# Altium footprint library Iris.PcbLib: 90 footprints (part 5 of 6)
Each footprint in its own frame and in the unit in brackets; x right, y up, seen from the top. Pads: shape width x height; smd on the part's side, far side on the other; paste and mask are expansions set on the pad; w line width, h text height; cw(c..) or ccw(c..) is an arc to the next point about the centre after c.
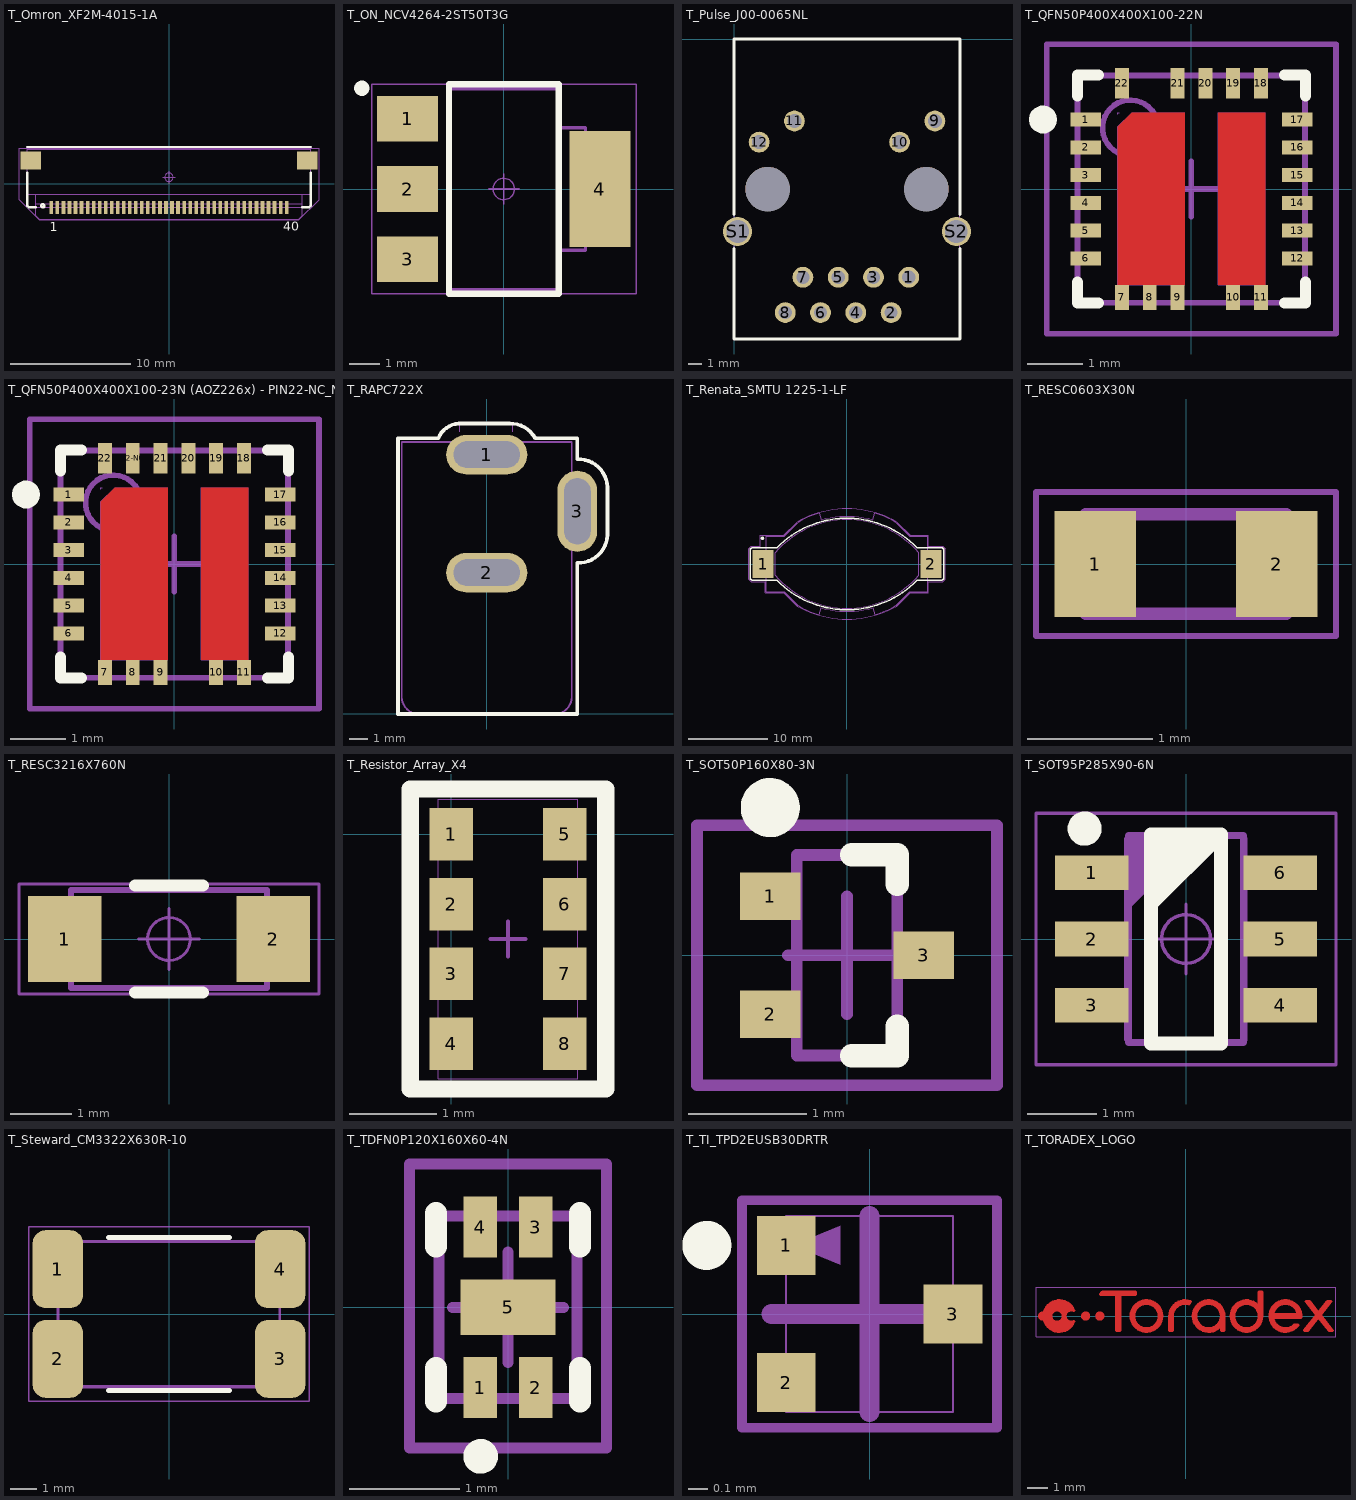
[diagram p4: the footprints below, top view; thin cyan lines are the x and y axes]

## T_Omron_XF2M-4015-1A [mm] "DVI FFC Connector 0.5mm pitch"
height 2
pads (42):
  rect 0.3x1.1 smd: 1(-9.75,-1.95) 2(-9.25,-1.95) 3(-8.75,-1.95) 4(-8.25,-1.95) 5(-7.75,-1.95) 6(-7.25,-1.95) 7(-6.75,-1.95) 8(-6.25,-1.95) 9(-5.75,-1.95) 10(-5.25,-1.95) 11(-4.75,-1.95) 12(-4.25,-1.95) 13(-3.75,-1.95) 14(-3.25,-1.95) 15(-2.75,-1.95) 16(-2.25,-1.95) 17(-1.75,-1.95) 18(-1.25,-1.95) 19(-0.75,-1.95) 20(-0.25,-1.95) 21(0.25,-1.95) 22(0.75,-1.95) 23(1.25,-1.95) 24(1.75,-1.95) 25(2.25,-1.95) 26(2.75,-1.95) 27(3.25,-1.95) 28(3.75,-1.95) 29(4.25,-1.95) 30(4.75,-1.95) 31(5.25,-1.95) 32(5.75,-1.95) 33(6.25,-1.95) 34(6.75,-1.95) 35(7.25,-1.95) 36(7.75,-1.95) 37(8.25,-1.95) 38(8.75,-1.95) 39(9.25,-1.95) 40(9.75,-1.95)
  rect 1.7x1.5 smd: ""(-11.45,1.95) ""(11.45,1.95)
Top Overlay:
  circle w0.2: c-10.459,-1.819 r0.125
  lines w0.2: -11.752,0.919 -11.752,-1.798 -11.6,-1.95 -11.05,-1.95 ; -11.752,3.057 11.75,3.057 ; 11.05,-1.95 11.6,-1.95 11.75,-1.8 11.75,0.917
  text "40" at 9.46,-3.899 h0.75
  text "1" at -9.885,-3.908 h0.75
Mechanical 1:
  circle w0.05: c0,0.55 r0.35
  lines w0.05: -0.5,0.55 0.5,0.55 ; 0,0.05 0,1.05 ; -12.436,-1.303 -10.761,-2.978 10.762,-2.978 12.436,-1.304 12.436,2.95 -12.436,2.95 -12.436,-1.303
Mechanical 2:
  lines w0.001: -11.75,-0.85 11.75,-0.85 ; -11.05,-1.95 -11.6,-1.95 -11.75,-1.8 -11.75,1.45 -12.05,1.45 -12.05,2.55 -11.75,2.55 -11.75,2.95 11.75,2.95 11.75,2.55 12.05,2.55 12.05,1.45 11.75,1.45 11.75,-1.8 11.6,-1.95 11.05,-1.95 ; -11.05,-1.65 11.05,-1.65 ; -11.05,-0.85 -11.05,-2.65 -10.75,-2.95 10.75,-2.95 11.05,-2.65 11.05,-0.85
Mechanical 3:
  lines w0.1: -11.752,-1.798 -11.6,-1.95 11.6,-1.95 11.75,-1.8 11.75,2.884 -11.752,2.884 -11.752,-1.798
3D body "xf2m-4015-1a.stp": height 2.02, standoff 0.02, extent -12.05,-2.95 12.05,2.95

## T_ON_NCV4264-2ST50T3G [mm] "SO4"
height 1.8
pads (4):
  rect 2x1.5 smd: 1(-3.15,2.3) 2(-3.15,0) 3(-3.15,-2.3)
  rect 2x3.8 smd: 4(3.15,0)
Top Overlay:
  circle w0.25: c-4.65,3.3 r0.125
  lines w0.2: -1.8,-3.43 1.8,-3.43 1.8,3.43 -1.8,3.43 -1.8,-3.43
Mechanical 1:
  circle w0.05: c0,0 r0.35
  lines w0.05: -0.5,0 0.5,0 ; 0,-0.5 0,0.5 ; -4.33,-3.43 4.33,-3.43 4.33,3.43 -4.33,3.43 -4.33,-3.43
Mechanical 2:
  lines w0.001: -1.85,-3.251 -1.85,3.251 1.85,3.251 1.85,-3.251 -1.85,-3.251
Mechanical 3:
  lines w0.1: 1.79,-2.006 2.68,-2.006 2.68,2.006 1.79,2.006 ; -1.79,-3.302 1.79,-3.302 1.79,3.302 -1.79,3.302 -1.79,-3.302
3D body "User Library-SOT223-3.step": height 1.7, standoff 0, extent -3.5,-3.25 3.5,3.25

## T_Pulse_J00-0065NL [mm] "RJ45 Connector"
height 13.84
pads (16):
  round 1.5 hole 0.95: 1(12.575,-17.15) 2(11.305,-19.69) 3(10.035,-17.15) 4(8.765,-19.69) 5(7.495,-17.15) 6(6.225,-19.69) 7(4.955,-17.15) 8(3.685,-19.69)
  round 1.5 hole 1.02: 9(14.455,-5.9) 10(11.915,-7.42) 11(4.345,-5.9) 12(1.805,-7.42)
  round 2.1 hole 1.63: S1(0.255,-13.85) S2(16.005,-13.85)
  round 3.2 hole 3.2 unplated: ""(2.415,-10.8) ""(13.845,-10.8)
Top Overlay:
  lines w0.2: 0,-15.086 0,-21.59 16.26,-21.59 16.26,-15.086 ; 0,-12.621 0,0 ; 16.26,-12.621 16.26,0 ; 0,0 16.26,0 ; 0,0 0,0 ; 16.26,0 16.26,0
Mechanical 1:
  lines w0.05: 0,-15.328 0,-21.59 16.26,-21.59 16.26,-15.328 ; 0,-12.626 0,0 16.26,0 16.26,-12.626
Mechanical 2:
  lines w0.001: 0,-21.59 0,0 16.26,0 16.26,-21.59 0,-21.59
Mechanical 3:
  lines w0.1: 0,-15.039 0,-21.59 16.26,-21.59 16.26,-15.039 ; 0,-12.612 0,0 16.26,0 16.26,-12.612
3D body "7499010211A.stp": height 13.32, standoff -3.23, extent 0.19,-21.75 16.07,0.09

## T_QFN50P400X400X100-22N [mm] "QFN, 22-Leads, Body 4.1x4.1mm (max), Pitch 0.50mm, IPC Medium Density"
height 1
pads (22):
  rect 0.55x0.25 smd mask+0.051: 1(-1.9,1.25) 2(-1.9,0.75) 3(-1.9,0.25) 4(-1.9,-0.25) 5(-1.9,-0.75) 6(-1.9,-1.25) 12(1.9,-1.25) 13(1.9,-0.75) 14(1.9,-0.25) 15(1.9,0.25) 16(1.9,0.75) 17(1.9,1.25)
  rect 0.25x0.45 smd mask+0.051: 7(-1.25,-1.95) 8(-0.75,-1.95) 9(-0.25,-1.95) 10(0.75,-1.95) 11(1.25,-1.95)
  rect 0.25x0.55 smd mask+0.051: 18(1.25,1.9) 19(0.75,1.9) 20(0.25,1.9) 21(-0.25,1.9) 22(-1.25,1.9)
Top Layer:
  region: -1.33,1.118 -1.073,1.375 -0.125,1.375 -0.125,-1.725 -1.33,-1.725
  region: 1.33,1.375 0.48,1.375 0.48,-1.725 1.33,-1.725
Top Overlay:
  circle w0.25: c-2.671,1.25 r0.125
  lines w0.2: -2.05,-1.676 -2.05,-2.05 -1.676,-2.05 ; -2.05,1.676 -2.05,2.05 -1.676,2.05 ; 1.676,-2.05 2.05,-2.05 2.05,-1.676 ; 1.676,2.05 2.05,2.05 2.05,1.676
Mechanical 1:
  lines w0.1: -0.5,0 0.5,0 ; 0,-0.5 0,0.5 ; -2.6,-2.6 -2.6,2.6 2.6,2.6 2.6,-2.6 -2.6,-2.6
Mechanical 2:
  lines w0.01: -1.325,1.345 -1.325,1.375 -1.295,1.375 ; -2,-2 -2,2 2,2 2,-2 -2,-2 ; -1.325,-1.725 -0.125,-1.725 -0.125,1.375 -1.068,1.375 -1.325,1.118 -1.325,-1.725 ; 0.48,-1.725 0.48,1.375 1.33,1.375 1.33,-1.725 0.48,-1.725
Mechanical 3:
  circle w0.1: c-1.1,1.1 r0.5
  lines w0.1: -2.05,-2.05 -2.05,2.05 2.05,2.05 2.05,-2.05 -2.05,-2.05
3D body: height 1, standoff 0.01, extent -2,-2 2,2

## T_QFN50P400X400X100-23N (AOZ226x) - PIN22-NC_NOPASTE [mm] "QFN, 23-Leads, Body 4.1x4.1mm (max), Pitch 0.50mm, IPC Medium Density"
height 1
pads (23):
  rect 0.55x0.25 smd mask+0.051: 1(-1.9,1.25) 2(-1.9,0.75) 3(-1.9,0.25) 4(-1.9,-0.25) 5(-1.9,-0.75) 6(-1.9,-1.25) 12(1.9,-1.25) 13(1.9,-0.75) 14(1.9,-0.25) 15(1.9,0.25) 16(1.9,0.75) 17(1.9,1.25)
  rect 0.25x0.45 smd mask+0.051: 7(-1.25,-1.95) 8(-0.75,-1.95) 9(-0.25,-1.95) 10(0.75,-1.95) 11(1.25,-1.95)
  rect 0.25x0.55 smd mask+0.051: 18(1.25,1.9) 19(0.75,1.9) 20(0.25,1.9) 21(-0.25,1.9) 22(-1.25,1.9)
  rect 0.25x0.55 smd paste-0.25 mask+0.051: 22-NC(-0.75,1.9)
Top Layer:
  region: 1.33,1.375 0.48,1.375 0.48,-1.725 1.33,-1.725
  region: -1.33,1.118 -1.073,1.375 -0.125,1.375 -0.125,-1.725 -1.33,-1.725
Top Overlay:
  circle w0.25: c-2.671,1.25 r0.125
  lines w0.2: -2.05,-1.676 -2.05,-2.05 -1.676,-2.05 ; -2.05,1.676 -2.05,2.05 -1.676,2.05 ; 1.676,-2.05 2.05,-2.05 2.05,-1.676 ; 1.676,2.05 2.05,2.05 2.05,1.676
Mechanical 1:
  lines w0.1: -0.5,0 0.5,0 ; 0,-0.5 0,0.5 ; -2.6,-2.6 2.6,-2.6 2.6,2.6 -2.6,2.6 -2.6,-2.6
Mechanical 2:
  lines w0.01: -1.325,1.345 -1.325,1.375 -1.295,1.375 ; -2,-2 2,-2 2,2 -2,2 -2,-2 ; -1.325,-1.725 -1.325,1.118 -1.068,1.375 -0.125,1.375 -0.125,-1.725 -1.325,-1.725 ; 0.48,-1.725 1.33,-1.725 1.33,1.375 0.48,1.375 0.48,-1.725
Mechanical 3:
  circle w0.1: c-1.1,1.1 r0.5
  lines w0.1: -2.05,-2.05 2.05,-2.05 2.05,2.05 -2.05,2.05 -2.05,-2.05
3D body: height 1, standoff 0.01, extent -2,-2 2,2

## T_RAPC722X [mm] "Connector, 2.1mm (Dia), 5.5mm(Dia), Round Power Socket"
height 10.7
pads (3):
  oval 4.3x2.1 hole 1.4 slot 3.5 at 0 deg: 1(0,13.74) 2(0,7.49)
  oval 2.1x4.3 hole 1.4 slot 3.5 at 90 deg: 3(4.8,10.74)
Top Overlay:
  lines w0.2: 1.196,15.393 -1.3,15.393 ccw(c-1.385,14.115) -2.569,14.6 -4.7,14.6 -4.7,0 4.79,0 4.79,8 ccw(c4.843,9.553) 6.396,9.499 6.396,11.996 ccw(c4.841,11.945) 4.79,13.5 4.79,14.59 4.78,14.6 2.569,14.6 ccw(c1.234,13.866) 1.2,15.388
Mechanical 1:
  lines w0.05: -1.332,15.393 1.164,15.393 ; -1.332,15.394 ccw(c-1.384,14.115) -2.568,14.6 -4.7,14.6 -4.7,0 4.8,0 4.8,8 ccw(c4.843,9.553) 6.396,9.499 6.396,11.996 ccw(c4.841,11.945) 4.8,13.5 4.8,14.6 2.568,14.6 ; 1.169,15.388 cw(c1.203,13.866) 2.537,14.6
Mechanical 2:
  lines w0.001: -1.432,14.95 -1.432,15.4 ; -1.4,13.95 -1.4,14.4 -4.5,14.4 -4.5,0.9 ccw(c-3.6,0.9) -3.6,0 3.6,0 ; 1.368,14.95 1.368,15.4 ; 1.4,13.95 1.4,14.4 4.5,14.4 4.5,0.9 cw(c3.6,0.9) 3.6,0
Mechanical 3:
  lines w0.1: -4.5,0.9 ccw(c-3.6,0.9) -3.6,0 3.6,0 ccw(c3.6,0.9) 4.5,0.9 4.5,14.4 -4.5,14.4 -4.5,0.9
3D body: height 10.7, standoff 0, extent -4.5,0 4.5,14.4
3D body: height 4, standoff -3.7, extent 4.5,9.45 4.7,11.85
3D body: height 4, standoff -3.7, extent -1.2,7.55 1.2,7.75
3D body: height 4, standoff -3.7, extent -1.4,13.55 1.4,13.75
3D body: height 9.59, standoff 3.21, extent -3.2,0 3.175,2
3D body: height 7.4, standoff 5.4, extent -1,0 0.992,2

## T_Renata_SMTU 1225-1-LF [mm] "Battery Holder"
height 4.8
pads (2):
  rect 2.6x3.5 smd: 1(-10.55,0) 2(10.55,0)
Top Overlay:
  circle w0.2: c-10.625,3.25 r0.125
  lines w0.2: -8.8,2.05 -11.95,2.05 -12.15,1.85 -12.15,-1.85 -11.95,-2.05 -8.795,-2.05 ; -8.799,-2.05 ccw(c0,6.55) 8.794,-2.055 ; -8.794,2.055 cw(c0,-6.55) 8.799,2.05 ; 8.797,-2.05 11.95,-2.05 12.15,-1.85 12.15,1.86 11.96,2.05 8.797,2.05
Mechanical 1:
  lines w0.05: -7.924,-3.605 -10.247,-3.605 -10.247,-2.251 -12.024,-2.251 -12.357,-1.918 -12.357,1.926 -12.026,2.257 -10.918,2.257 -10.918,3.585 -7.95,3.585 -6.259,5.275 ; -7.92,-3.607 -6.244,-5.283 ; -6.262,5.274 cw(c0,-5.7) 6.276,5.266 ; -6.238,-5.288 ccw(c0,5.7) 6.239,-5.287 ; 6.244,-5.282 7.933,-3.593 10.237,-3.593 10.237,-2.245 12.04,-2.245 12.345,-1.94 12.345,1.939 12.037,2.247 10.242,2.247 10.242,3.589 7.956,3.589 6.281,5.265 6.281,5.266
Mechanical 2:
  lines w0.01: -6.194,5.206 -7.9,3.5 -10.15,3.5 -10.15,-3.5 -7.9,-3.5 -6.191,-5.209 ; -6.192,5.208 cw(c0.004,-5.568) -3.513,6.355 ; -6.189,-5.21 ccw(c0,5.57) -3.515,-6.353 ; -3.514,-6.353 -3.256,-5.514 ccw(c0.001,6.351) 3.246,-5.517 ; -3.513,6.354 -3.246,5.517 ; -3.245,5.516 cw(c0,-6.352) 3.246,5.516 3.505,6.356 cw(c0,-5.57) 6.189,5.21 ; 3.247,-5.517 3.517,-6.352 ccw(c0,5.57) 6.198,-5.205 7.903,-3.5 7.899,-3.5 10.15,-3.5 10.15,3.5 7.9,3.5 6.192,5.209
Mechanical 3:
  lines w0.1: -9.03,-1.42 -9.03,1.42 ; -9.028,-1.424 ccw(c0,6.357) 9.028,-1.424 ; -9.028,1.424 cw(c0,-6.357) 9.028,1.424 ; 9.026,-1.424 9.026,1.416

## T_RESC0603X30N [mm] "Film Resistor 0603 (1608 metric), max height 0.45mm"
height 0.45
pads (2):
  rect 0.65x0.85 smd: 1(-0.725,0) 2(0.725,0)
Mechanical 1:
  lines w0.05: -1.2,-0.575 1.2,-0.575 1.2,0.575 -1.2,0.575 -1.2,-0.575
Mechanical 2:
  lines w0.001: -0.8,-0.4 0.8,-0.4 0.8,0.4 -0.8,0.4 -0.8,-0.4
Mechanical 3:
  lines w0.1: -0.8,-0.4 0.8,-0.4 0.8,0.4 -0.8,0.4 -0.8,-0.4
3D body "User Library-RES_1609-0603.step": height 0.56, standoff 0, extent -0.85,-0.4 0.85,0.4

## T_RESC3216X760N [mm]
height 0.6
pads (2):
  rect 1.2x1.4 smd: 1(-1.7,0) 2(1.7,0)
Top Overlay:
  lines w0.2: -0.55,-0.875 0.55,-0.875 ; -0.55,0.875 0.55,0.875
Mechanical 1:
  circle w0.05: c0,0 r0.35
  lines w0.05: -0.5,0 0.5,0 ; 0,-0.5 0,0.5 ; -2.45,-0.9 2.45,-0.9 2.45,0.9 -2.45,0.9 -2.45,-0.9
Mechanical 2:
  lines w0.001: -1.6,-0.8 -1.6,0.8 1.6,0.8 1.6,-0.8 -1.6,-0.8
Mechanical 3:
  lines w0.1: -1.6,-0.8 1.6,-0.8 1.6,0.8 -1.6,0.8 -1.6,-0.8
3D body: height 0.6, standoff 0, extent -1.6,-0.8 1.6,0.8

## T_Resistor_Array_X4 [mm] "Resistor Array 0.8mm"
pads (8):
  rect 0.5x0.6 smd: 1(0,0) 2(0,-0.8) 3(0,-1.6) 4(0,-2.4) 5(1.3,0) 6(1.3,-0.8) 7(1.3,-1.6) 8(1.3,-2.4)
Top Overlay:
  lines w0.2: -0.47,-2.92 1.77,-2.92 1.77,0.52 -0.47,0.52 -0.47,-2.92
Mechanical 1:
  lines w0.05: 0.45,-1.2 0.85,-1.2 ; 0.65,-1.4 0.65,-1 ; -0.47,-2.92 1.77,-2.92 1.77,0.52 -0.47,0.52 -0.47,-2.92
Mechanical 2:
  lines w0.001: -0.15,-2.8 1.45,-2.8 1.45,0.4 -0.15,0.4 -0.15,-2.8
Mechanical 3:
  lines w0.1: -0.47,-2.92 1.77,-2.92 1.77,0.52 -0.47,0.52 -0.47,-2.92
3D body "User Library-Array-1206-4Way-Var1.STEP": height 0.5, standoff 0, extent -0.15,-2.8 1.45,0.4

## T_SOT50P160X80-3N [mm] "SOT23, 3-Leads, Body 1.7x1.8mm (max), Pitch 0.50mm, IPC Medium Density"
height 0.8
pads (3):
  rect 0.51x0.4 smd: 1(-0.65,0.5) 2(-0.65,-0.5) 3(0.65,0)
Top Overlay:
  circle w0.25: c-0.65,1.25 r0.125
  lines w0.2: 0.039,-0.85 0.425,-0.85 0.425,-0.6 ; 0.039,0.85 0.425,0.85 0.425,0.6
Mechanical 1:
  lines w0.1: -1.27,-1.1 1.27,-1.1 1.27,1.1 -1.27,1.1 -1.27,-1.1
Mechanical 3:
  lines w0.1: -0.5,0 0.5,0 ; 0,-0.5 0,0.5 ; -0.425,-0.85 0.425,-0.85 0.425,0.85 -0.425,0.85 -0.425,-0.85
3D body: height 0.8, standoff 0.12, extent -0.425,-0.85 0.425,0.85

## T_SOT95P285X90-6N [mm]
height 1.45
pads (6):
  rect 1.05x0.5 smd: 1(-1.35,0.95) 2(-1.35,0) 3(-1.35,-0.95) 4(1.35,-0.95) 5(1.35,0) 6(1.35,0.95)
Top Overlay:
  circle w0.25: c-1.453,1.582 r0.12
  lines w0.2: -0.5,0.5 0.5,1.5 ; -0.5,0.7 0.3,1.5 ; -0.5,0.9 0.1,1.5 ; -0.5,1.1 -0.1,1.5 ; -0.5,1.3 -0.3,1.5 ; 0.5,1.5 -0.5,1.5 -0.5,-1.5 0.5,-1.5 0.5,1.5
Mechanical 1:
  circle w0.05: c0,0 r0.35
  lines w0.05: -0.5,0 0.5,0 ; 0,-0.5 0,0.5 ; -2.15,-1.8 -2.15,1.8 2.15,1.8 2.15,-1.8 -2.15,-1.8
Mechanical 2:
  lines w0.001: -0.875,-1.45 0.875,-1.45 0.875,1.45 -0.875,1.45 -0.875,-1.45
Mechanical 3:
  lines w0.1: -0.825,0.485 0.175,1.485 ; -0.825,0.585 0.075,1.485 ; -0.825,0.685 -0.025,1.485 ; -0.825,0.785 -0.125,1.485 ; -0.825,0.885 -0.225,1.485 ; -0.825,0.985 -0.325,1.485 ; -0.825,1.085 -0.425,1.485 ; -0.825,1.185 -0.525,1.485 ; -0.825,1.285 -0.625,1.485 ; -0.825,1.385 -0.725,1.485 ; -0.825,-1.485 -0.825,1.485 0.825,1.485 0.825,-1.485 -0.825,-1.485
3D body "User Library-SOT23-6-2.step": height 1.45, standoff 0, extent -1.4,-1.45 1.4,1.45

## T_Steward_CM3322X630R-10 [mm] "Common Mode Choke"
height 2.85
pads (4):
  rrect50% 1.91x2.95 smd: 1(-4.22,1.705) 2(-4.22,-1.705) 3(4.22,-1.705) 4(4.22,1.705)
Top Overlay:
  lines w0.2: -2.3,-2.902 2.3,-2.902 ; -2.3,2.904 2.3,2.904
Mechanical 1:
  lines w0.05: -5.316,-3.321 5.316,-3.321 5.316,3.321 -5.316,3.321 -5.316,-3.321
Mechanical 2:
  lines w0.001: -4.25,-2.8 4.25,-2.8 4.25,2.8 -4.25,2.8 -4.25,-2.8
Mechanical 3:
  lines w0.1: -4.2,-2.75 4.2,-2.75 4.2,2.75 -4.2,2.75 -4.2,-2.75

## T_TDFN0P120X160X60-4N [mm] "TDFN, 4-Leads, Body 1.6x1.2mm (max), Pitch 0.50mm, IPC Medium Density"
height 0.6
pads (5):
  rect 0.3x0.55 smd: 1(-0.25,-0.725) 2(0.25,-0.725) 3(0.25,0.725) 4(-0.25,0.725)
  rect 0.86x0.5 smd paste-0.05: 5(0,0)
Top Overlay:
  circle w0.175: c-0.247,-1.346 r0.069
  lines w0.2: -0.65,-0.85 -0.65,-0.55 ; -0.65,0.55 -0.65,0.85 ; 0.65,-0.85 0.65,-0.55 ; 0.65,0.55 0.65,0.85
Mechanical 1:
  lines w0.1: -0.889,-1.27 0.889,-1.27 0.889,1.295 -0.889,1.295 -0.889,-1.27
Mechanical 3:
  lines w0.1: -0.5,0 0.5,0 ; 0,-0.5 0,0.5 ; -0.625,-0.825 0.625,-0.825 0.625,0.825 -0.625,0.825 -0.625,-0.825
3D body: height 0.6, standoff 0.05, extent -0.625,-0.825 0.625,0.825

## T_TI_TPD2EUSB30DRTR [mm] "2 CHANNEL PROTECTION SOLUTION FOR SUPER-SPEED"
height 0.5
pads (3):
  rect 0.3x0.3 smd: 1(-0.425,0.35) 2(-0.425,-0.35) 3(0.425,0)
Top Overlay:
  circle w0.15: c-0.83,0.35 r0.05
Mechanical 1:
  lines w0.05: -0.65,-0.58 -0.65,0.58 0.65,0.58 0.65,-0.58 -0.65,-0.58
Mechanical 2:
  lines w0.01: -0.425,-0.5 0.425,-0.5 0.425,0.5 -0.425,0.5 -0.425,-0.5
Mechanical 3:
  region: -0.39,0.35 -0.15,0.45 -0.15,0.25
  lines w0.1: -0.5,0 0.5,0 ; 0,-0.5 0,0.5
3D body: height 0.5, standoff 0, extent -0.425,-0.5 0.425,0.5

## T_TORADEX_LOGO [mm] "Toradex Logo"
Top Layer:
  lines w0.15: -6.969,-0.148 cw(c-6.99,0) -7.14,0 cw(c-6.99,0) -6.969,0.148 ; -6.97,0 -6.854,0 ; -6.898,-0.21 ccw(c-6.177,0) -5.475,-0.269 ; -6.898,0.21 cw(c-6.177,0) -5.475,0.269 ; -6.765,-0.068 ccw(c-6.958,-0.227) -6.854,0 ; -6.765,0.068 cw(c-6.958,0.227) -6.854,0 ; -6.619,-0.35 ccw(c-6.177,0) -5.81,-0.428 cw(c-5.593,0) -5.942,-0.329 cw(c-6.29,0) -6.77,0 cw(c-6.29,0) -5.942,0.329 cw(c-5.593,0) -5.81,0.428 ccw(c-6.177,0) -6.619,0.35 ; -6.338,-0.54 ccw(c-6.29,0) -5.942,-0.415 ccw(c-5.593,0) -5.921,-0.431 cw(c-6.177,0) -6.046,-0.484 ; -6.338,0.54 cw(c-6.29,0) -5.942,0.415 cw(c-5.593,0) -5.921,0.431 ccw(c-6.177,0) -6.046,0.484 ; -5.49,-0.282 cw(c-5.593,0) -5.49,0.282 ; 4.229,0.004 4.848,0.004 5.529,0.004 ccw(c4.848,0) 5.359,-0.449 ; 4.233,-0.066 4.848,-0.066 5.596,-0.066 ccw(c4.848,0) 5.45,-0.449 5.273,-0.449 cw(c4.848,0) 5.463,0.066 4.848,0.066 4.233,0.066 ; -7.095,0 cw(c-6.99,0) -6.976,0.104 ccw(c-6.958,0.227) -6.838,0.193 cw(c-6.177,0) -5.586,0.355 ccw(c-5.593,0) -5.942,0.064 ccw(c-6.29,0) -5.942,-0.064 ccw(c-5.593,0) -5.586,-0.355 cw(c-6.177,0) -6.838,-0.193 ccw(c-6.958,-0.227) -6.976,-0.104 ; -7.095,0 ccw(c-6.99,0) -6.976,-0.104 ; -7.095,0 ccw(c-6.99,0) -6.976,-0.104 ; -7.033,0 cw(c-6.99,0) -6.984,0.042 ccw(c-6.958,0.227) -6.778,0.175 cw(c-6.177,0) -5.698,0.404 ccw(c-5.593,0) -5.942,0.229 ccw(c-6.29,0) -5.942,-0.229 ccw(c-5.593,0) -5.698,-0.404 cw(c-6.177,0) -6.778,-0.175 ccw(c-6.958,-0.227) -6.984,-0.042 cw(c-6.99,0) -7.033,0 ; -6.59,0 ccw(c-6.29,0) -5.99,0 ccw(c-6.29,0) -6.59,0 ; -5.048,0 cw(c-4.898,0) -4.748,0 cw(c-4.898,0) -5.048,0 ; -5.003,0 cw(c-4.898,0) -4.793,0 cw(c-4.898,0) -5.003,0 ; -4.94,0 cw(c-4.898,0) -4.856,0 cw(c-4.898,0) -4.94,0 ; -4.352,0 cw(c-4.202,0) -4.052,0 cw(c-4.202,0) -4.352,0 ; -4.307,0 cw(c-4.202,0) -4.097,0 cw(c-4.202,0) -4.307,0 ; -4.244,0 cw(c-4.202,0) -4.16,0 cw(c-4.202,0) -4.244,0 ; -4.176,1.044 -3.377,1.044 -3.377,-0.701 -3.226,-0.701 -3.226,1.044 -2.457,1.044 -2.457,1.174 -4.072,1.174 -4.176,1.044 ; -4.046,1.106 -3.315,1.106 -3.315,-0.638 -3.288,-0.638 -3.288,1.106 -2.519,1.106 -2.519,1.112 -4.042,1.112 -4.046,1.106 ; -2.681,0 cw(c-1.93,0) -1.178,0 cw(c-1.93,0) -2.681,0 ; -2.619,0 cw(c-1.93,0) -1.241,0 cw(c-1.93,0) -2.619,0 ; -2.548,0 cw(c-1.93,0) -1.311,0 cw(c-1.93,0) -2.548,0 ; -0.793,-0.701 -0.66,-0.701 -0.66,0 cw(c-0.042,0) 0.137,0.592 cw(c1.104,0) 0.216,0.705 ccw(c-0.042,0) -0.793,0 -0.793,-0.701 ; -0.731,-0.638 -0.723,-0.638 -0.723,0 cw(c-0.042,0) 0.109,0.664 cw(c1.104,0) 0.114,0.671 ccw(c-0.042,0) -0.731,0 -0.731,-0.638 ; 0.352,0 cw(c1.104,0) 1.855,0 1.855,-0.701 1.722,-0.701 1.722,-0.427 cw(c1.104,0) 0.352,0 ; 0.415,0 cw(c1.104,0) 1.793,0 1.793,-0.638 1.785,-0.638 1.785,-0.104 cw(c1.104,0) 0.415,0 ; 0.485,0 ccw(c1.104,0) 1.722,0 ccw(c1.104,0) 0.485,0 ; 2.199,0 cw(c2.95,0) 3.569,0.427 3.569,1.174 3.702,1.174 3.702,0 cw(c2.95,0) 2.199,0 ; 2.261,0 cw(c2.95,0) 3.631,0.104 3.631,1.112 3.639,1.112 3.639,0 cw(c2.95,0) 2.261,0 ; 2.332,0 ccw(c2.95,0) 3.569,0 ccw(c2.95,0) 2.332,0 ; 5.769,-0.701 5.937,-0.701 6.46,-0.036 6.98,-0.701 7.14,-0.701 6.548,0.056 7.065,0.714 6.895,0.714 6.46,0.15 6.025,0.714 5.862,0.714 6.375,0.055 5.769,-0.701 ; 5.899,-0.638 5.906,-0.638 6.46,0.065 7.011,-0.638 7.012,-0.638 6.469,0.056 6.936,0.651 6.926,0.651 6.46,0.048 5.994,0.651 5.99,0.651 6.455,0.055 5.899,-0.638
Top Solder:
  lines w0.35: -6.969,-0.148 cw(c-6.99,0) -7.14,0 cw(c-6.99,0) -6.969,0.148 ; -6.97,0 -6.854,0 ; -6.967,-0.166 cw(c-6.958,-0.227) -6.898,-0.21 ccw(c-6.177,0) -5.475,-0.269 ; -6.967,0.166 ccw(c-6.958,0.227) -6.898,0.21 cw(c-6.177,0) -5.475,0.269 ; -6.765,-0.068 ccw(c-6.958,-0.227) -6.854,0 ; -6.765,0.068 cw(c-6.958,0.227) -6.854,0 ; -6.619,-0.35 ccw(c-6.177,0) -5.81,-0.428 cw(c-5.593,0) -5.942,-0.329 cw(c-6.29,0) -6.77,0 cw(c-6.29,0) -5.942,0.329 cw(c-5.593,0) -5.81,0.428 ccw(c-6.177,0) -6.619,0.35 ; -6.338,-0.54 ccw(c-6.29,0) -5.942,-0.415 ccw(c-5.593,0) -5.921,-0.431 cw(c-6.177,0) -6.046,-0.484 ; -6.338,0.54 cw(c-6.29,0) -5.942,0.415 cw(c-5.593,0) -5.921,0.431 ccw(c-6.177,0) -6.046,0.484 ; -5.485,-0.28 cw(c-5.593,0) -5.485,0.28 ; 4.229,0.004 4.848,0.004 5.529,0.004 ccw(c4.848,0) 5.359,-0.449 ; 4.233,-0.066 4.848,-0.066 5.596,-0.066 ccw(c4.848,0) 5.45,-0.449 5.273,-0.449 cw(c4.848,0) 5.463,0.066 4.848,0.066 4.233,0.066 ; -7.095,0 cw(c-6.99,0) -6.976,0.104 ccw(c-6.958,0.227) -6.838,0.193 cw(c-6.177,0) -5.586,0.355 ccw(c-5.593,0) -5.942,0.064 ccw(c-6.29,0) -5.942,-0.064 ccw(c-5.593,0) -5.586,-0.355 cw(c-6.177,0) -6.838,-0.193 ccw(c-6.958,-0.227) -6.976,-0.104 ; -7.095,0 ccw(c-6.99,0) -6.976,-0.104 ; -7.095,0 ccw(c-6.99,0) -6.976,-0.104 ; -7.033,0 cw(c-6.99,0) -6.984,0.042 ccw(c-6.958,0.227) -6.778,0.175 cw(c-6.177,0) -5.698,0.404 ccw(c-5.593,0) -5.942,0.229 ccw(c-6.29,0) -5.942,-0.229 ccw(c-5.593,0) -5.698,-0.404 cw(c-6.177,0) -6.778,-0.175 ccw(c-6.958,-0.227) -6.984,-0.042 cw(c-6.99,0) -7.033,0 ; -6.59,0 ccw(c-6.29,0) -5.99,0 ccw(c-6.29,0) -6.59,0 ; -5.048,0 cw(c-4.898,0) -4.748,0 cw(c-4.898,0) -5.048,0 ; -5.003,0 cw(c-4.898,0) -4.793,0 cw(c-4.898,0) -5.003,0 ; -4.94,0 cw(c-4.898,0) -4.856,0 cw(c-4.898,0) -4.94,0 ; -4.352,0 cw(c-4.202,0) -4.052,0 cw(c-4.202,0) -4.352,0 ; -4.307,0 cw(c-4.202,0) -4.097,0 cw(c-4.202,0) -4.307,0 ; -4.244,0 cw(c-4.202,0) -4.16,0 cw(c-4.202,0) -4.244,0 ; -4.176,1.044 -3.377,1.044 -3.377,-0.701 -3.226,-0.701 -3.226,1.044 -2.457,1.044 -2.457,1.174 -4.072,1.174 -4.176,1.044 ; -4.046,1.106 -3.315,1.106 -3.315,-0.638 -3.288,-0.638 -3.288,1.106 -2.519,1.106 -2.519,1.112 -4.042,1.112 -4.046,1.106 ; -2.681,0 cw(c-1.93,0) -1.178,0 cw(c-1.93,0) -2.681,0 ; -2.619,0 cw(c-1.93,0) -1.241,0 cw(c-1.93,0) -2.619,0 ; -2.548,0 cw(c-1.93,0) -1.311,0 cw(c-1.93,0) -2.548,0 ; -0.793,-0.701 -0.66,-0.701 -0.66,0 cw(c-0.042,0) 0.137,0.592 cw(c1.104,0) 0.216,0.705 ccw(c-0.042,0) -0.793,0 -0.793,-0.701 ; -0.731,-0.638 -0.723,-0.638 -0.723,0 cw(c-0.042,0) 0.109,0.664 cw(c1.104,0) 0.114,0.671 ccw(c-0.042,0) -0.731,0 -0.731,-0.638 ; 0.352,0 cw(c1.104,0) 1.855,0 1.855,-0.701 1.722,-0.701 1.722,-0.427 cw(c1.104,0) 0.352,0 ; 0.415,0 cw(c1.104,0) 1.793,0 1.793,-0.638 1.785,-0.638 1.785,-0.104 cw(c1.104,0) 0.415,0 ; 0.485,0 ccw(c1.104,0) 1.722,0 ccw(c1.104,0) 0.485,0 ; 2.199,0 cw(c2.95,0) 3.569,0.427 3.569,1.174 3.702,1.174 3.702,0 cw(c2.95,0) 2.199,0 ; 2.261,0 cw(c2.95,0) 3.631,0.104 3.631,1.112 3.639,1.112 3.639,0 cw(c2.95,0) 2.261,0 ; 2.332,0 ccw(c2.95,0) 3.569,0 ccw(c2.95,0) 2.332,0 ; 5.769,-0.701 5.937,-0.701 6.46,-0.036 6.98,-0.701 7.14,-0.701 6.548,0.056 7.065,0.714 6.895,0.714 6.46,0.15 6.025,0.714 5.862,0.714 6.375,0.055 5.769,-0.701 ; 5.899,-0.638 5.906,-0.638 6.46,0.065 7.011,-0.638 7.012,-0.638 6.469,0.056 6.936,0.651 6.926,0.651 6.46,0.048 5.994,0.651 5.99,0.651 6.455,0.055 5.899,-0.638
Mechanical 1:
  lines w0.01: -7.315,-1.016 -7.315,1.397 7.315,1.397 7.315,-1.016 -7.315,-1.016